# Altium footprint library EMDC_Packages.PcbLib: 274 footprints (part 16 of 18)
Each footprint in its own frame and in the unit in brackets; x right, y up, seen from the top. Pads: shape width x height; smd on the part's side, far side on the other; paste and mask are expansions set on the pad; w line width, h text height; cw(c..) or ccw(c..) is an arc to the next point about the centre after c.
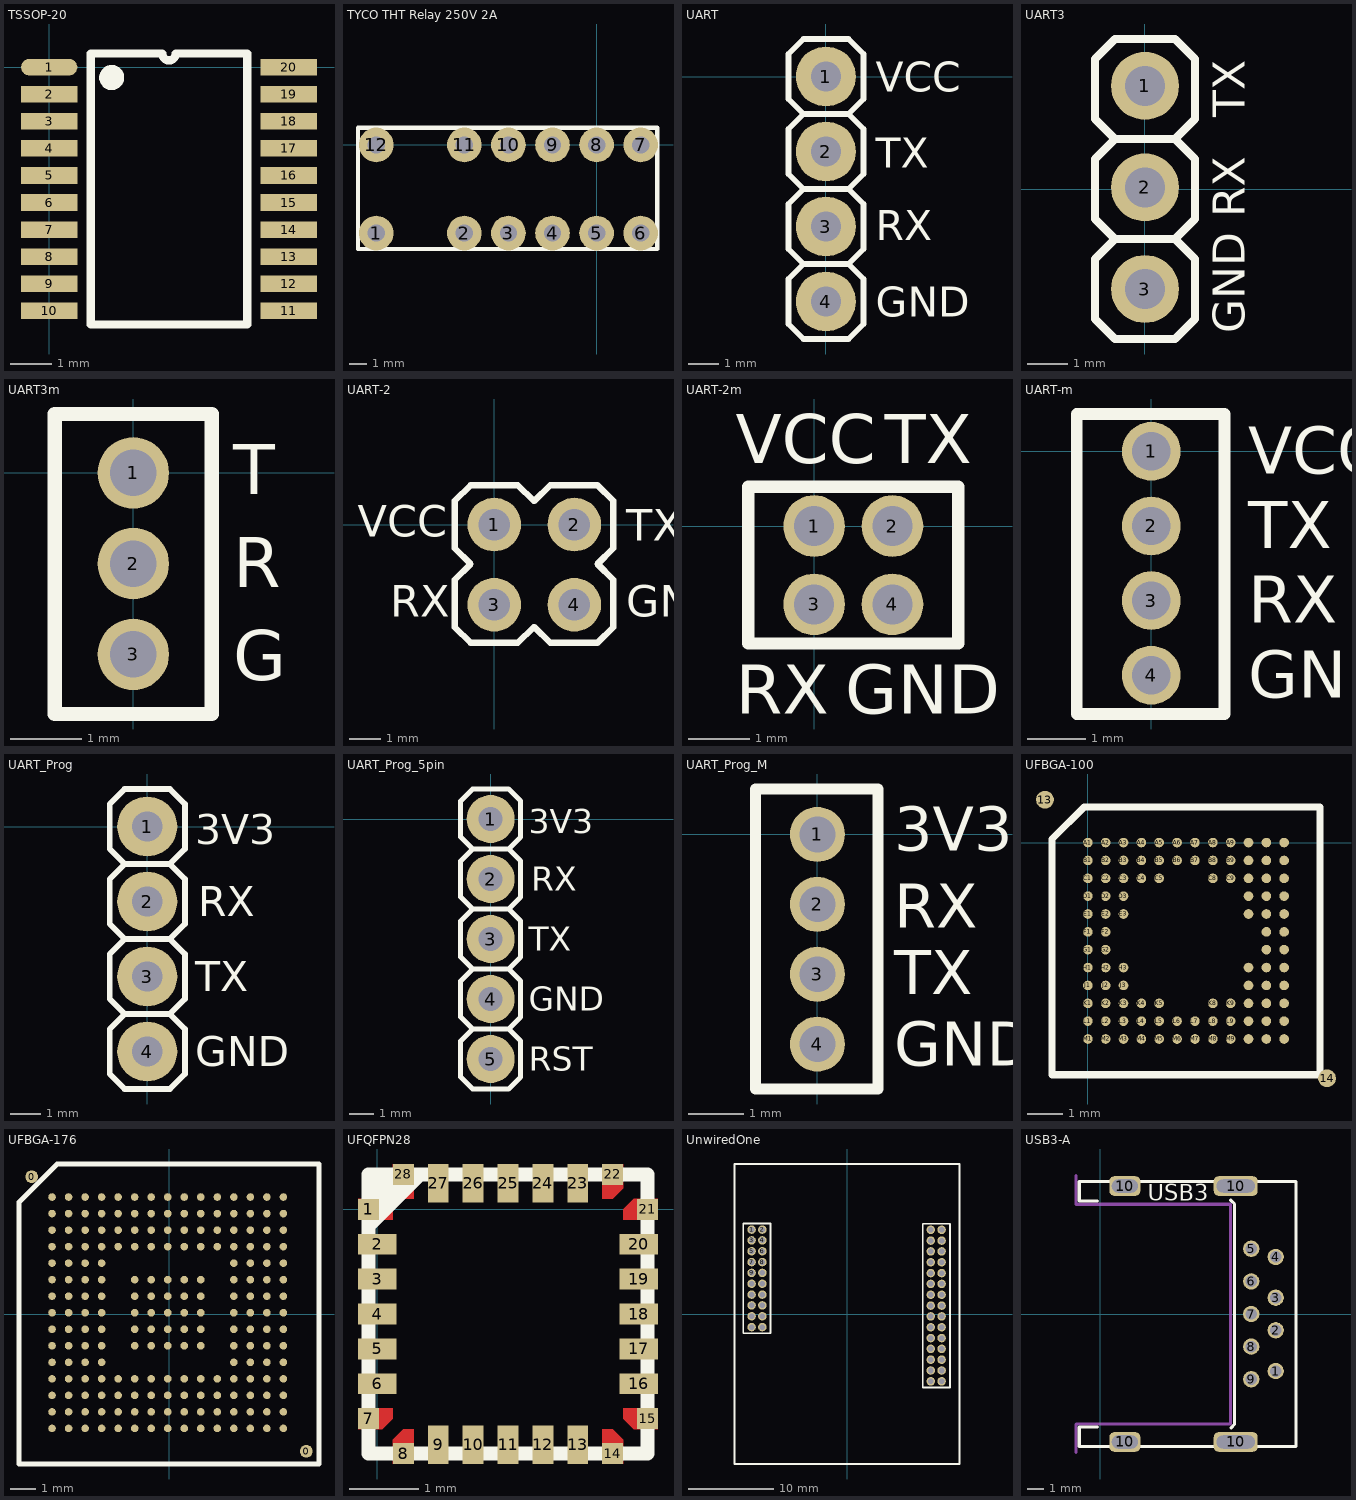
[diagram p15: the footprints below, top view; thin cyan lines are the x and y axes]

## TSSOP-20 [mm]
pads (20):
  oval 1.35x0.4 smd: 1(0,0)
  rect 1.35x0.4 smd: 2(0,-0.65) 3(0,-1.3) 4(0,-1.95) 5(0,-2.6) 6(0,-3.25) 7(0,-3.9) 8(0,-4.55) 9(0,-5.2) 10(0,-5.85) 11(5.75,-5.85) 12(5.75,-5.2) 13(5.75,-4.55) 14(5.75,-3.9) 15(5.75,-3.25) 16(5.75,-2.6) 17(5.75,-1.95) 18(5.75,-1.3) 19(5.75,-0.65) 20(5.75,0)
Top Overlay:
  circle w0.3: c1.5,-0.25 r0.15
  lines w0.2: 1,-6.175 1,0.325 2.713,0.325 ccw(c2.875,0.325) 3.037,0.325 4.75,0.325 4.75,-6.175 1,-6.175
3D body "User Library-tssop-20-1.STEP": height 1.2, standoff 0, extent -0.425,-6.225 6.175,0.375

## TYCO THT Relay 250V 2A [mm]
pads (12):
  round 2 hole 1: 1(-12.7,-5.08) 2(-7.62,-5.08) 3(-5.08,-5.08) 4(-2.54,-5.08) 5(0,-5.08) 6(2.54,-5.08) 7(2.54,0) 8(0,0) 9(-2.54,0) 10(-5.08,0) 11(-7.62,0) 12(-12.7,0)
Top Overlay:
  lines w0.254: -13.75,-6 -13.75,1 3.5,1 3.5,-6 -13.75,-6

## UART [mm]
pads (4):
  round 2 hole 1: 1(0,0) 2(0,-2.5) 3(0,-5) 4(0,-7.5)
Top Overlay:
  lines w0.2: -0.75,-6.25 0.75,-6.25 ; -0.75,-6.25 -1.25,-5.75 -1.25,-4.25 -0.75,-3.75 ; -0.75,-6.25 -1.25,-6.75 -1.25,-8.25 -0.75,-8.75 0.75,-8.75 1.25,-8.25 1.25,-6.75 0.75,-6.25 ; -0.75,-3.75 -1.25,-3.25 -1.25,-1.75 -0.75,-1.25 ; -0.75,-3.75 0.75,-3.75 ; -0.75,-1.25 0.75,-1.25 ; -0.75,-1.25 -1.25,-0.75 -1.25,0.75 -0.75,1.25 0.75,1.25 1.25,0.75 1.25,-0.75 0.75,-1.25 ; 0.75,-6.25 1.25,-5.75 1.25,-4.25 0.75,-3.75 ; 0.75,-3.75 1.25,-3.25 1.25,-1.75 0.75,-1.25
  text "VCC" at 1.651,-0.508 h1
  text "TX" at 1.651,-3.048 h1
  text "RX" at 1.651,-5.461 h1
  text "GND" at 1.651,-8.001 h1
3D body "User Library-PLS-1.STEP": height 8.44, standoff -3, extent -1.27,-1.27 1.27,1.27
3D body "User Library-PLS-1.STEP": height 8.44, standoff -3, extent -1.27,-3.77 1.27,-1.23
3D body "User Library-PLS-1.STEP": height 8.44, standoff -3, extent -1.27,-6.27 1.27,-3.73
3D body "User Library-PLS-1.STEP": height 8.44, standoff -3, extent -1.27,-8.77 1.27,-6.23

## UART3 [mm] "UART connector 3pin"
pads (3):
  round 1.7 hole 1 paste+0: 1(0,2.58) 2(0,0.04) 3(0,-2.5)
Top Overlay:
  lines w0.2: -0.75,-1.25 -1.25,-0.75 -1.25,0.75 -0.75,1.25 ; -0.75,-1.25 -1.25,-1.75 -1.25,-3.25 -0.75,-3.75 0.75,-3.75 1.25,-3.25 1.25,-1.75 0.75,-1.25 ; -0.75,-1.25 0.75,-1.25 ; -0.75,1.25 -1.25,1.75 -1.25,3.25 -0.75,3.75 0.75,3.75 1.25,3.25 1.25,1.75 0.75,1.25 ; -0.75,1.25 0.75,1.25 ; 0.75,-1.25 1.25,-0.75 1.25,0.75 0.75,1.25
  text "TX" at 2.5,1.8 h0.8
  text "RX" at 2.5,-0.7 h0.8
  text "GND" at 2.5,-3.6 h0.8
3D body "User Library-PLS-1.STEP": height 8.44, standoff -3, extent -1.27,1.31 1.27,3.85
3D body "User Library-PLS-1.STEP": height 8.44, standoff -3, extent -1.27,-1.23 1.27,1.31
3D body "User Library-PLS-1.STEP": height 8.44, standoff -3, extent -1.27,-3.77 1.27,-1.23

## UART3m [mm] "UART 3pin PLL"
pads (3):
  round 1 hole 0.65: 1(0,0) 2(0,-1.27) 3(0,-2.54)
Top Overlay:
  lines w0.2: -1.1,-3.375 1.1,-3.375 1.1,0.825 -1.1,0.825 -1.1,-3.375
  text "T" at 1.4,-0.3 h0.7
  text "R" at 1.4,-1.6 h0.7
  text "G" at 1.4,-2.9 h0.7
3D body "PLL-3.stp": height 5.2, standoff -2.9, extent -1.1,-3.38 1.1,0.84

## UART-2 [mm]
pads (4):
  round 1.7 hole 1 paste+0: 1(0,0) 2(2.54,0) 3(0,-2.54) 4(2.54,-2.54)
Top Overlay:
  lines w0.2: 1.25,-3.25 0.75,-3.75 -0.75,-3.75 -1.25,-3.25 -1.25,-1.75 -0.75,-1.25 -1.25,-0.75 -1.25,0.75 -0.75,1.25 0.75,1.25 1.25,0.75 ; 1.275,-3.25 1.775,-3.75 3.275,-3.75 3.775,-3.25 3.775,-1.75 3.275,-1.25 3.775,-0.75 3.775,0.75 3.275,1.25 1.775,1.25 1.275,0.75
  text "GND" at 4.191,-2.921 h1
  text "RX" at -3.302,-2.921 h1
  text "TX" at 4.191,-0.508 h1
  text "VCC" at -4.318,-0.381 h1
3D body "User Library-PLS-1.STEP": height 8.44, standoff -3, extent 1.27,-3.81 3.81,-1.27
3D body "User Library-PLS-1.STEP": height 8.44, standoff -3, extent -1.27,-3.81 1.27,-1.27
3D body "User Library-PLS-1.STEP": height 8.44, standoff -3, extent 1.27,-1.27 3.81,1.27
3D body "User Library-PLS-1.STEP": height 8.44, standoff -3, extent -1.27,-1.27 1.27,1.27

## UART-2m [mm]
pads (4):
  round 1 hole 0.65: 1(0,0) 2(1.27,0) 3(0,-1.27) 4(1.27,-1.27)
Top Overlay:
  lines w0.2: -1.067,-1.905 2.337,-1.905 2.337,0.635 -1.067,0.635 -1.067,-1.905
  text "VCC" at -1.27,1.016 h0.8
  text "TX" at 1.143,1.016 h0.8
  text "RX" at -1.27,-3.048 h0.8
  text "GND" at 0.508,-3.048 h0.8
3D body "PLL-2.stp": height 5.2, standoff -2.9, extent -1.1,-2.1 1.1,0.85
3D body "PLL-2.stp": height 5.2, standoff -2.9, extent 0.17,-2.1 2.37,0.85

## UART-m [mm]
pads (4):
  round 1 hole 0.65: 1(0,0) 2(0,-1.27) 3(0,-2.54) 4(0,-3.81)
Top Overlay:
  lines w0.2: -1.27,-4.47 1.245,-4.47 1.245,0.635 -1.27,0.635 -1.27,-4.47
  text "VCC" at 1.651,-0.381 h0.8
  text "TX" at 1.651,-1.651 h0.8
  text "RX" at 1.651,-2.921 h0.8
  text "GND" at 1.651,-4.191 h0.8
3D body "PLL-2.stp": height 5.2, standoff -2.9, extent -1.1,-2.1 1.1,0.85
3D body "PLL-2.stp": height 5.2, standoff -2.9, extent -1.1,-4.64 1.1,-1.69

## UART_Prog [mm] "UART_Prog"
pads (4):
  round 2 hole 1: 1(0,0) 2(0,-2.5) 3(0,-5) 4(0,-7.5)
Top Overlay:
  lines w0.2: -0.75,-6.25 0.75,-6.25 ; -0.75,-6.25 -1.25,-5.75 -1.25,-4.25 -0.75,-3.75 ; -0.75,-6.25 -1.25,-6.75 -1.25,-8.25 -0.75,-8.75 0.75,-8.75 1.25,-8.25 1.25,-6.75 0.75,-6.25 ; -0.75,-3.75 -1.25,-3.25 -1.25,-1.75 -0.75,-1.25 ; -0.75,-3.75 0.75,-3.75 ; -0.75,-1.25 0.75,-1.25 ; -0.75,-1.25 -1.25,-0.75 -1.25,0.75 -0.75,1.25 0.75,1.25 1.25,0.75 1.25,-0.75 0.75,-1.25 ; 0.75,-6.25 1.25,-5.75 1.25,-4.25 0.75,-3.75 ; 0.75,-3.75 1.25,-3.25 1.25,-1.75 0.75,-1.25
  text "3V3" at 1.6,-0.6 h1
  text "RX" at 1.7,-3 h1
  text "TX" at 1.6,-5.5 h1
  text "GND" at 1.6,-8 h1
3D body "User Library-PLS-1.STEP": height 8.44, standoff -3, extent -1.27,-8.85 1.27,-6.31
3D body "User Library-PLS-1.STEP": height 8.44, standoff -3, extent -1.27,-1.27 1.27,1.27
3D body "User Library-PLS-1.STEP": height 8.44, standoff -3, extent -1.27,-3.81 1.27,-1.27
3D body "User Library-PLS-1.STEP": height 8.44, standoff -3, extent -1.27,-6.35 1.27,-3.81

## UART_Prog_5pin [mm]
pads (5):
  round 2 hole 1: 1(0,0) 2(0,-2.5) 3(0,-5) 4(0,-7.5) 5(0,-10)
Top Overlay:
  lines w0.2: -0.75,-8.75 -1.25,-9.25 -1.25,-10.75 -0.75,-11.25 0.75,-11.25 1.25,-10.75 1.25,-9.25 0.75,-8.75 ; -0.75,-8.75 -1.25,-8.25 -1.25,-6.75 -0.75,-6.25 ; -0.75,-8.75 0.75,-8.75 ; -0.75,-6.25 0.75,-6.25 ; -0.75,-6.25 -1.25,-5.75 -1.25,-4.25 -0.75,-3.75 ; -0.75,-3.75 -1.25,-3.25 -1.25,-1.75 -0.75,-1.25 ; -0.75,-3.75 0.75,-3.75 ; -0.75,-1.25 0.75,-1.25 ; -0.75,-1.25 -1.25,-0.75 -1.25,0.75 -0.75,1.25 0.75,1.25 1.25,0.75 1.25,-0.75 0.75,-1.25 ; 0.75,-8.75 1.25,-8.25 1.25,-6.75 0.75,-6.25 ; 0.75,-6.25 1.25,-5.75 1.25,-4.25 0.75,-3.75 ; 0.75,-3.75 1.25,-3.25 1.25,-1.75 0.75,-1.25
  text "3V3" at 1.6,-0.6 h1
  text "RX" at 1.7,-3 h1
  text "TX" at 1.6,-5.5 h1
  text "GND" at 1.6,-8 h1
  text "RST" at 1.6,-10.5 h1
3D body "User Library-PLS-1.STEP": height 8.44, standoff -3, extent -1.27,-8.85 1.27,-6.31
3D body "User Library-PLS-1.STEP": height 8.44, standoff -3, extent -1.27,-1.27 1.27,1.27
3D body "User Library-PLS-1.STEP": height 8.44, standoff -3, extent -1.27,-3.81 1.27,-1.27
3D body "User Library-PLS-1.STEP": height 8.44, standoff -3, extent -1.27,-6.35 1.27,-3.81
3D body "User Library-PLS-1.STEP": height 8.44, standoff -3, extent -1.27,-11.35 1.27,-8.81

## UART_Prog_M [mm]
pads (4):
  round 1 hole 0.65: 1(0,0) 2(0,-1.27) 3(0,-2.54) 4(0,-3.81)
Top Overlay:
  lines w0.2: -1.125,-4.625 1.1,-4.625 1.1,0.825 -1.125,0.825 -1.125,-4.625
  text "GND" at 1.4,-4.2 h0.8
  text "TX" at 1.4,-2.9 h0.8
  text "RX" at 1.4,-1.7 h0.8
  text "3V3" at 1.4,-0.3 h0.8
3D body "PLL-2.stp": height 5.2, standoff -2.9, extent -1.1,-2.1 1.1,0.85
3D body "PLL-2.stp": height 5.2, standoff -2.9, extent -1.1,-4.64 1.1,-1.69

## UFBGA-100 [mm] "7x7mm, 0.5mm"
pads (102):
  round 0.5 smd mask+0.3: 13(-1.2,1.2) 14(6.7,-6.6)
  round 0.27 smd: A1(0,0) A2(0.5,0) A3(1,0) A4(1.5,0) A5(2,0) A6(2.5,0) A7(3,0) A8(3.5,0) A9(4,0) A10(4.5,0) A11(5,0) A12(5.5,0) B1(0,-0.5) B2(0.5,-0.5) B3(1,-0.5) B4(1.5,-0.5) B5(2,-0.5) B6(2.5,-0.5) B7(3,-0.5) B8(3.5,-0.5) B9(4,-0.5) B10(4.5,-0.5) B11(5,-0.5) B12(5.5,-0.5) C1(0,-1) C2(0.5,-1) C3(1,-1) C4(1.5,-1) C5(2,-1) C8(3.5,-1) C9(4,-1) C10(4.5,-1) C11(5,-1) C12(5.5,-1) D1(0,-1.5) D2(0.5,-1.5) D3(1,-1.5) D10(4.5,-1.5) D11(5,-1.5) D12(5.5,-1.5) E1(0,-2) E2(0.5,-2) E3(1,-2) E10(4.5,-2) E11(5,-2) E12(5.5,-2) F1(0,-2.5) F2(0.5,-2.5) F11(5,-2.5) F12(5.5,-2.5) G1(0,-3) G2(0.5,-3) G11(5,-3) G12(5.5,-3) H1(0,-3.5) H2(0.5,-3.5) H3(1,-3.5) H10(4.5,-3.5) H11(5,-3.5) H12(5.5,-3.5) J1(0,-4) J2(0.5,-4) J3(1,-4) J10(4.5,-4) J11(5,-4) J12(5.5,-4) K1(0,-4.5) K2(0.5,-4.5) K3(1,-4.5) K4(1.5,-4.5) K5(2,-4.5) K8(3.5,-4.5) K9(4,-4.5) K10(4.5,-4.5) K11(5,-4.5) K12(5.5,-4.5) L1(0,-5) L2(0.5,-5) L3(1,-5) L4(1.5,-5) L5(2,-5) L6(2.5,-5) L7(3,-5) L8(3.5,-5) L9(4,-5) L10(4.5,-5) L11(5,-5) L12(5.5,-5) M1(0,-5.5) M2(0.5,-5.5) M3(1,-5.5) M4(1.5,-5.5) M5(2,-5.5) M6(2.5,-5.5) M7(3,-5.5) M8(3.5,-5.5) M9(4,-5.5) M10(4.5,-5.5) M11(5,-5.5) M12(5.5,-5.5)
Top Overlay:
  lines w0.2: -1,-6.5 6.5,-6.5 6.5,1 -0.1,1 -1,0.1 -1,-6.5
3D body: height 0.53, standoff 0, extent -0.8,-6.2 6.2,0.8

## UFBGA-176 [mm] "10x10mm, 0.5mm"
pads (203):
  round 0.5 smd mask+0.3: 0(-5.4,5.4) 0(5.4,-5.4)
  round 0.3 smd: A1(-4.6,4.6) A2(-3.95,4.6) A3(-3.3,4.6) A4(-2.65,4.6) A5(-2,4.6) A6(-1.35,4.6) A7(-0.7,4.6) A8(-0.05,4.6) A9(0.6,4.6) A10(1.25,4.6) A11(1.9,4.6) A12(2.55,4.6) A13(3.2,4.6) A14(3.85,4.6) A15(4.5,4.6) B1(-4.6,3.95) B2(-3.95,3.95) B3(-3.3,3.95) B4(-2.65,3.95) B5(-2,3.95) B6(-1.35,3.95) B7(-0.7,3.95) B8(-0.05,3.95) B9(0.6,3.95) B10(1.25,3.95) B11(1.9,3.95) B12(2.55,3.95) B13(3.2,3.95) B14(3.85,3.95) B15(4.5,3.95) C1(-4.6,3.3) C2(-3.95,3.3) C3(-3.3,3.3) C4(-2.65,3.3) C5(-2,3.3) C6(-1.35,3.3) C7(-0.7,3.3) C8(-0.05,3.3) C9(0.6,3.3) C10(1.25,3.3) C11(1.9,3.3) C12(2.55,3.3) C13(3.2,3.3) C14(3.85,3.3) C15(4.5,3.3) D1(-4.6,2.65) D2(-3.95,2.65) D3(-3.3,2.65) D4(-2.65,2.65) D5(-2,2.65) D6(-1.35,2.65) D7(-0.7,2.65) D8(-0.05,2.65) D9(0.6,2.65) D10(1.25,2.65) D11(1.9,2.65) D12(2.55,2.65) D13(3.2,2.65) D14(3.85,2.65) D15(4.5,2.65) E1(-4.6,2) E2(-3.95,2) E3(-3.3,2) E4(-2.65,2) E12(2.55,2) E13(3.2,2) E14(3.85,2) E15(4.5,2) F1(-4.6,1.35) F2(-3.95,1.35) F3(-3.3,1.35) F4(-2.65,1.35) F6(-1.35,1.35) F7(-0.7,1.35) F8(-0.05,1.35) F9(0.6,1.35) F10(1.25,1.35) F12(2.55,1.35) F13(3.2,1.35) F14(3.85,1.35) F15(4.5,1.35) G1(-4.6,0.7) G2(-3.95,0.7) G3(-3.3,0.7) G4(-2.65,0.7) G6(-1.35,0.7) G7(-0.7,0.7) G8(-0.05,0.7) G9(0.6,0.7) G10(1.25,0.7) G12(2.55,0.7) G13(3.2,0.7) G14(3.85,0.7) G15(4.5,0.7) H1(-4.6,0.05) H2(-3.95,0.05) H3(-3.3,0.05) H4(-2.65,0.05) H6(-1.35,0.05) H7(-0.7,0.05) H8(-0.05,0.05) H9(0.6,0.05) H10(1.25,0.05) H12(2.55,0.05) H13(3.2,0.05) H14(3.85,0.05) H15(4.5,0.05) J1(-4.6,-0.6) J2(-3.95,-0.6) J3(-3.3,-0.6) J4(-2.65,-0.6) J6(-1.35,-0.6) J7(-0.7,-0.6) J8(-0.05,-0.6) J9(0.6,-0.6) J10(1.25,-0.6) J12(2.55,-0.6) J13(3.2,-0.6) J14(3.85,-0.6) J15(4.5,-0.6) K1(-4.6,-1.25) K2(-3.95,-1.25) K3(-3.3,-1.25) K4(-2.65,-1.25) K6(-1.35,-1.25) K7(-0.7,-1.25) K8(-0.05,-1.25) K9(0.6,-1.25) K10(1.25,-1.25) K12(2.55,-1.25) K13(3.2,-1.25) K14(3.85,-1.25) K15(4.5,-1.25) L1(-4.6,-1.9) L2(-3.95,-1.9) L3(-3.3,-1.9) L4(-2.65,-1.9) L12(2.55,-1.9) L13(3.2,-1.9) L14(3.85,-1.9) L15(4.5,-1.9) M1(-4.6,-2.55) M2(-3.95,-2.55) M3(-3.3,-2.55) M4(-2.65,-2.55) M5(-2,-2.55) M6(-1.35,-2.55) M7(-0.7,-2.55) M8(-0.05,-2.55) M9(0.6,-2.55) M10(1.25,-2.55) M11(1.9,-2.55) M12(2.55,-2.55) M13(3.2,-2.55) M14(3.85,-2.55) M15(4.5,-2.55) N1(-4.6,-3.2) N2(-3.95,-3.2) N3(-3.3,-3.2) N4(-2.65,-3.2) N5(-2,-3.2) N6(-1.35,-3.2) N7(-0.7,-3.2) N8(-0.05,-3.2) N9(0.6,-3.2) N10(1.25,-3.2) N11(1.9,-3.2) N12(2.55,-3.2) N13(3.2,-3.2) N14(3.85,-3.2) N15(4.5,-3.2) P1(-4.6,-3.85) P2(-3.95,-3.85) P3(-3.3,-3.85) P4(-2.65,-3.85) P5(-2,-3.85) P6(-1.35,-3.85) P7(-0.7,-3.85) P8(-0.05,-3.85) P9(0.6,-3.85) P10(1.25,-3.85) P11(1.9,-3.85) P12(2.55,-3.85) P13(3.2,-3.85) P14(3.85,-3.85) P15(4.5,-3.85) R1(-4.6,-4.5) R2(-3.95,-4.5) R3(-3.3,-4.5) R4(-2.65,-4.5) R5(-2,-4.5) R6(-1.35,-4.5) R7(-0.7,-4.5) R8(-0.05,-4.5) R9(0.6,-4.5) R10(1.25,-4.5) R11(1.9,-4.5) R12(2.55,-4.5) R13(3.2,-4.5) R14(3.85,-4.5) R15(4.5,-4.5)
Top Overlay:
  lines w0.2: -5.9,-5.9 -5.9,4.4 -4.4,5.9 5.9,5.9 5.9,-5.9 -5.9,-5.9
3D body: height 0.5, standoff 0, extent -5,-5 5,5

## UFQFPN28 [mm]
pads (28):
  rect 0.3x0.3 smd: 1(-0.125,0) 7(-0.125,-3) 8(0.375,-3.5) 14(3.375,-3.5) 15(3.875,-3) 21(3.875,0) 22(3.375,0.5) 28(0.375,0.5)
  rect 0.55x0.3 smd: 2(0,-0.5) 3(0,-1) 4(0,-1.5) 5(0,-2) 6(0,-2.5) 16(3.75,-2.5) 17(3.75,-2) 18(3.75,-1.5) 19(3.75,-1) 20(3.75,-0.5)
  rect 0.3x0.55 smd: 9(0.875,-3.375) 10(1.375,-3.375) 11(1.875,-3.375) 12(2.375,-3.375) 13(2.875,-3.375) 23(2.875,0.375) 24(2.375,0.375) 25(1.875,0.375) 26(1.375,0.375) 27(0.875,0.375)
Top Layer:
  region: 4.025,0.15 3.675,0.15 3.525,0 3.525,-0.15 4.025,-0.15
  region: 3.525,0.65 3.525,0.3 3.375,0.15 3.225,0.15 3.225,0.65
  region: 3.525,-3.65 3.525,-3.3 3.375,-3.15 3.225,-3.15 3.225,-3.65
  region: 4.025,-3.15 3.675,-3.15 3.525,-3 3.525,-2.85 4.025,-2.85
  region: -0.275,-3.15 0.075,-3.15 0.225,-3 0.225,-2.85 -0.275,-2.85
  region: 0.225,-3.65 0.225,-3.3 0.375,-3.15 0.525,-3.15 0.525,-3.65
  region: -0.275,0.15 0.075,0.15 0.225,0 0.225,-0.15 -0.275,-0.15
  region: 0.225,0.65 0.225,0.3 0.375,0.15 0.525,0.15 0.525,0.65
  lines w0: 0.075,0.3 0.075,0.3
Top Overlay:
  region: -0.125,0.5 -0.125,-0.375 0.75,0.5
  lines w0.2: -0.125,-3.5 -0.125,0.5 3.875,0.5 3.875,-3.5 -0.125,-3.5
3D body "User Library-qfn20-4x4.step": height 0.92, standoff 0, extent -0.125,-3.5 3.875,0.5

## UnwiredOne [mm] "UnwiredOne board"
pads (50):
  round 1 hole 0.65: 1(-11.2,9.9) 2(-9.93,9.9) 3(-11.2,8.63) 4(-9.93,8.63) 5(-11.2,7.36) 6(-9.93,7.36) 7(-11.2,6.09) 8(-9.93,6.09) 9(-11.2,4.82) 10(-9.93,4.82) 11(-11.2,3.55) 12(-9.93,3.55) 13(-11.2,2.28) 14(-9.93,2.28) 15(-11.2,1.01) 16(-9.93,1.01) 17(-11.2,-0.26) 18(-9.93,-0.26) 19(-11.2,-1.53) 20(-9.93,-1.53) 21(11.1,-7.9) 22(9.83,-7.9) 23(11.1,-6.63) 24(9.83,-6.63) 25(11.1,-5.36) 26(9.83,-5.36) 27(11.1,-4.09) 28(9.83,-4.09) 29(11.1,-2.82) 30(9.83,-2.82) 31(11.1,-1.55) 32(9.83,-1.55) 33(11.1,-0.28) 34(9.83,-0.28) 35(11.1,0.99) 36(9.83,0.99) 37(11.1,2.26) 38(9.83,2.26) 39(11.1,3.53) 40(9.83,3.53) 41(11.1,4.8) 42(9.83,4.8) 43(11.1,6.07) 44(9.83,6.07) 45(11.1,7.34) 46(9.83,7.34) 47(11.1,8.61) 48(9.83,8.61) 49(11.1,9.88) 50(9.83,9.88)
Top Overlay:
  lines w0.2: -13.2,-17.6 13.2,-17.6 13.2,17.6 -13.2,17.6 -13.2,-17.6 ; -12.175,-2.25 -8.975,-2.25 -8.975,10.625 -12.175,10.625 -12.175,-2.25 ; 8.875,-8.625 12.075,-8.625 12.075,4.25 12.075,10.6 8.875,10.6 8.875,4.25 8.875,-8.625
3D body "User Library-PLLD1_27-xxPLLD1_27-20.STEP": height 4.7, standoff -2.6, extent -12.075,-2.165 -9.075,10.535
3D body "User Library-PLLD1_27-xxPLLD1_27-30.STEP": height 4.7, standoff -2.6, extent 8.975,-8.535 11.975,10.515

## USB3-A [mm] "USB 3.0 Type A connector"
pads (13):
  round 1 hole 0.7: 1(10.75,-3.5) 2(10.75,-1) 3(10.75,1) 4(10.75,3.5) 5(9.25,4) 6(9.25,2) 7(9.25,0) 8(9.25,-2) 9(9.25,-4)
  rrect50% 1.9x1.2 hole 0.8 slot 1.6 at 0 deg: 10(1.5,-7.85) 10(1.5,7.85)
  rrect50% 2.7x1.2 hole 0.8 slot 2.35 at 0 deg: 10(8.3,-7.85) 10(8.3,7.85)
Top Overlay:
  lines w0.2: -0.2,6.925 -1.3,6.925 -1.3,8.125 12,8.125 12,-8.125 -1.3,-8.125 -1.3,-6.925 -0.175,-6.925 ; 8,6.975 8.225,6.75 8.225,6.725 8.225,-6.75 8.225,-6.775 8.025,-6.975
  text "USB3" at 2.9,6.95 h1
Mechanical 1:
  lines w0.2: -1.5,-8.5 -1.5,-6.75 7.975,-6.75 7.975,0 7.975,6.725 -1.5,6.725 -1.5,8.5
3D body "c-1932847-1-a-3d.stp": height 5.63, standoff -1.63, extent -3.85,-8 12.02,8